# Altium footprint library DrPCB.PcbLib: 910 footprints (part 57 of 57)
Each footprint in its own frame and in the unit in brackets; x right, y up, seen from the top. Pads: shape width x height; smd on the part's side, far side on the other; paste and mask are expansions set on the pad; w line width, h text height; cw(c..) or ccw(c..) is an arc to the next point about the centre after c.
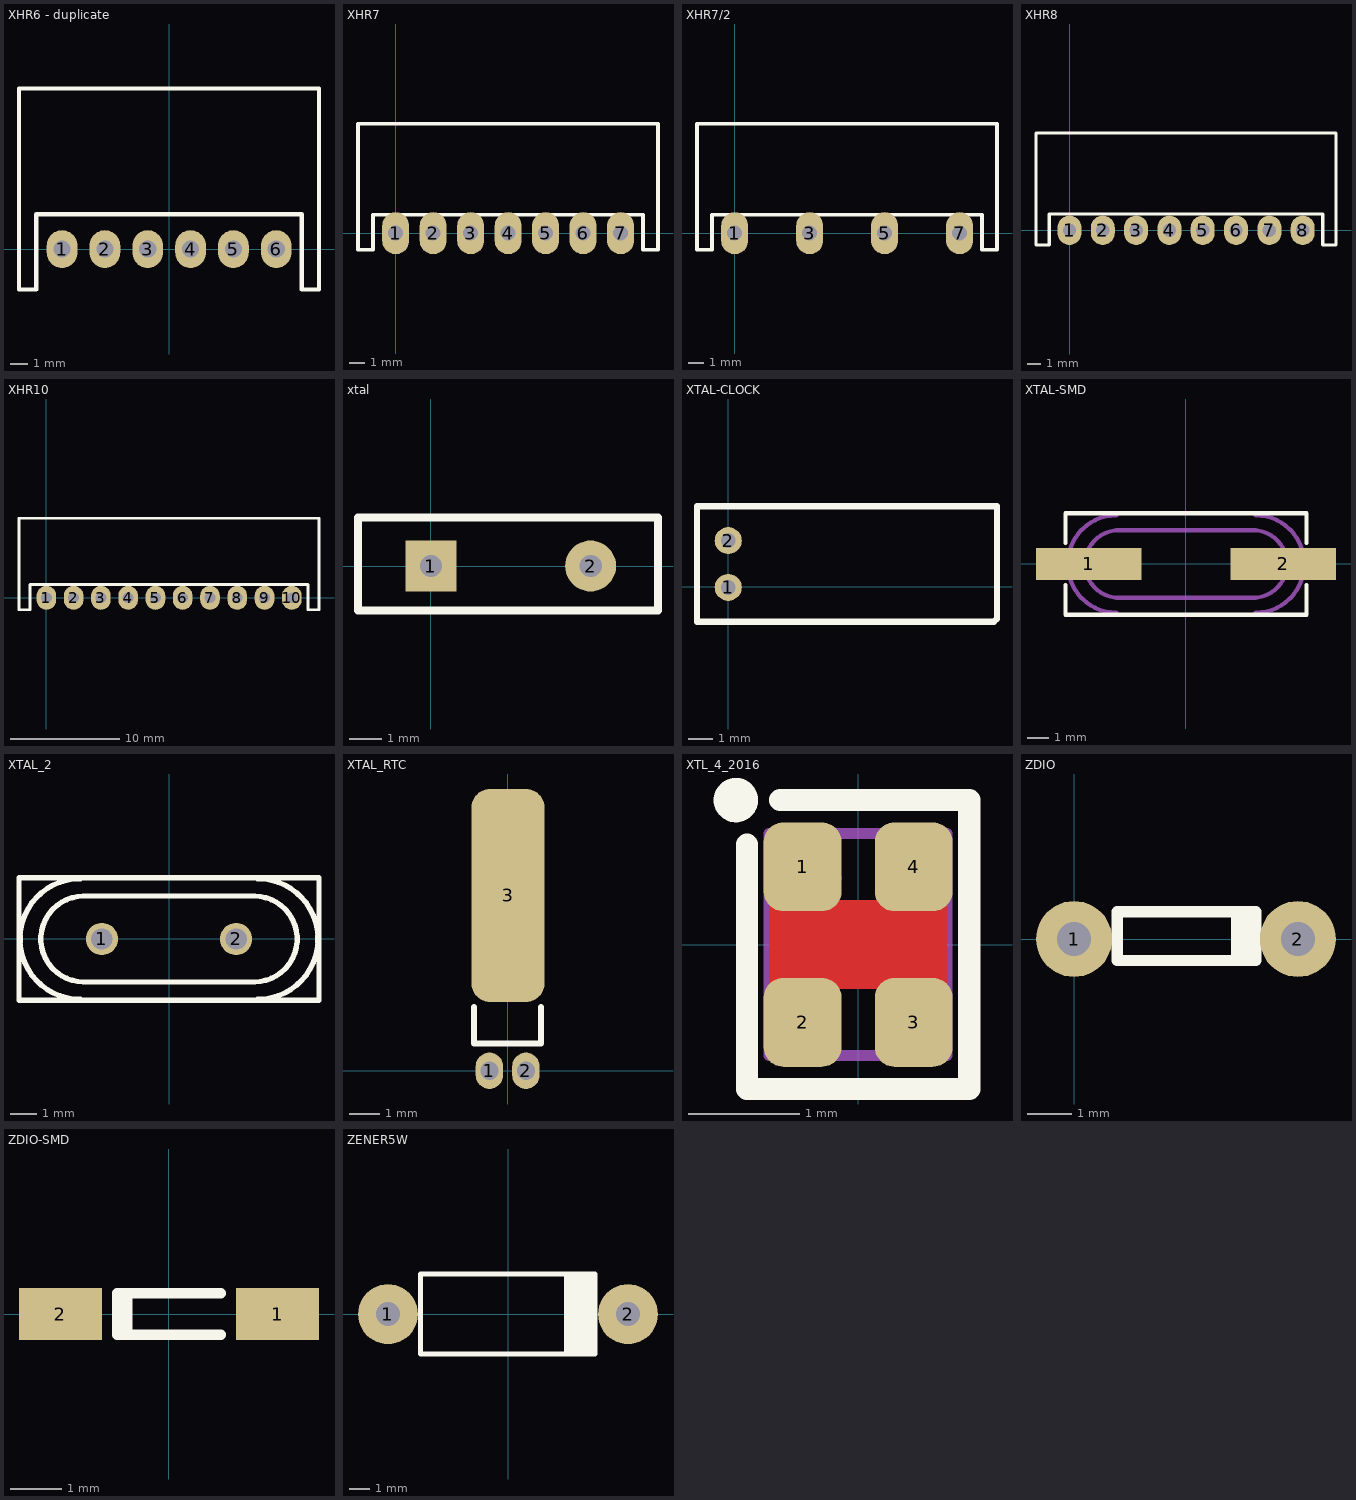
[diagram p56: the footprints below, top view; thin cyan lines are the x and y axes]

## XHR6 - duplicate [mm]
pads (6):
  oval 1.8x2.2 hole 1: 1(-6.25,0) 2(-3.75,0) 3(-1.25,0) 4(1.25,0) 5(3.75,0) 6(6.25,0)
Top Overlay:
  lines w0.254: -8.763,-2.362 -8.763,9.373 8.745,9.373 8.745,-2.362 7.745,-2.362 7.745,2.032 -7.763,2.032 -7.763,-2.362 -8.763,-2.362
3D body "User Library-S XH-A.step": height 6.1, standoff -2, extent -8.713,-2.254 8.687,9.246

## XHR7 [mm]
pads (7):
  oval 1.8x2.8 hole 1: 1(0,0) 2(2.5,0) 3(5,0) 4(7.5,0) 5(10,0) 6(12.5,0) 7(15.004,0)
Top Overlay:
  lines w0.254: -2.515,7.3 17.475,7.3 ; -2.513,7.3 -2.513,-1.1 -1.513,-1.1 -1.513,1.227 ; -1.511,1.227 16.497,1.227 16.497,-1.1 17.497,-1.1 17.497,7.3

## XHR7/2 [mm]
pads (4):
  oval 1.8x2.8 hole 1: 1(0,0) 3(5,0) 5(10,0) 7(15.004,0)
Top Overlay:
  lines w0.254: -2.515,7.3 17.475,7.3 ; -2.513,7.3 -2.513,-1.1 -1.513,-1.1 -1.513,1.227 ; -1.511,1.227 16.497,1.227 16.497,-1.1 17.497,-1.1 17.497,7.3

## XHR8 [mm]
pads (8):
  oval 1.8x2.2 hole 1: 1(0,0) 2(2.5,0) 3(5,0) 4(7.5,0) 5(10,0) 6(12.5,0) 7(15.004,0) 8(17.504,0)
Top Overlay:
  lines w0.254: -2.515,7.3 20.002,7.3 ; -2.513,7.3 -2.513,-1.1 -1.513,-1.1 -1.513,1.227 ; -1.511,1.227 18.974,1.227 ; 18.999,1.227 18.999,-1.1 19.999,-1.1 19.999,7.3

## XHR10 [mm]
pads (10):
  oval 1.8x2.2 hole 1: 1(0,0) 2(2.5,0) 3(5,0) 4(7.5,0) 5(10,0) 6(12.5,0) 7(15.004,0) 8(17.504,0) 9(20.008,0) 10(22.508,0)
Top Overlay:
  lines w0.254: -2.515,7.3 24.981,7.3 ; -2.513,7.3 -2.513,-1.1 -1.513,-1.1 -1.513,1.227 ; -1.511,1.227 23.927,1.227 ; 24.002,1.227 24.002,-1.1 25.003,-1.1 25.003,7.3

## xtal [mm]
pads (2):
  rect 1.6x1.6 hole 0.7: 1(0,0)
  round 1.6 hole 0.7: 2(5,0)
Top Overlay:
  lines w0.254: -2.286,-1.397 -2.286,1.524 7.112,1.524 7.112,-1.397 -2.286,-1.397

## XTAL-CLOCK [mm]
pads (2):
  round 1.1 hole 0.6: 1(0.007,-0.021) 2(0.007,1.884)
Top Overlay:
  lines w0.254: -1.263,-1.418 10.802,-1.418 10.929,-1.291 10.929,3.281 -1.263,3.281 -1.263,-1.418

## XTAL-SMD [mm]
pads (2):
  rect 5x1.5 smd: 1(-4.6,0) 2(4.6,0)
Top Overlay:
  lines w0.2: -5.7,-1 -5.7,-2.4 5.7,-2.4 5.7,-1 ; -5.7,1 -5.7,2.4 5.7,2.4 5.7,1
Mechanical 13:
  lines w0.2: -3.302,-2.3 cw(c-3.302,0) -3.302,2.3 ; -3.302,-1.6 3.302,-1.6 ; -3.302,1.6 3.302,1.6 ; -3.175,-1.6 cw(c-3.175,0) -3.175,1.6 ; 3.175,-1.6 ccw(c3.175,0) 3.175,1.6 ; 3.302,-2.3 ccw(c3.302,0) 3.302,2.3
3D body "User Library-Crystal HC49_US-SM.step": height 4.3, standoff 0, extent -6.4,-2.415 6.4,2.415

## XTAL_2 [mm] "Crystal PTH HC49S"
height 5.08
pads (2):
  round 1.2 / inner oval 1.2x2 / far side oval 1.2x2 hole 0.8: 1(-2.5,0)
  round 1.2 / inner round 1.2 / far side oval 1.2x2 hole 0.8: 2(2.5,0)
Top Overlay:
  lines w0.2: -3.302,-2.25 cw(c-3.302,0) -3.302,2.25 ; -3.2,-1.6 3.2,-1.6 ; -3.2,1.6 3.2,1.6 ; -3.175,-1.6 cw(c-3.175,0) -3.175,1.6 ; 3.175,-1.6 ccw(c3.175,0) 3.175,1.6 ; 3.302,-2.25 ccw(c3.302,0) 3.302,2.25 ; -5.588,-2.286 -5.588,2.286 5.588,2.286 5.588,-2.286 -5.588,-2.286
3D body "HC-49_LT_THT_16MHz.step": height 3.6, standoff -1.99, extent -5.668,-2.325 5.669,2.325

## XTAL_RTC [mm] "CRYSTAL RTC SLEEP, AB26T"
height 2.3
pads (3):
  oval 0.9x1.2 hole 0.6 mask+0.1: 1(-0.6,0) 2(0.6,0)
  rrect50% 2.4x7 smd: 3(0.011,5.763)
Top Overlay:
  lines w0.2: -1.1,2.1 -1.1,0.9 1.1,0.9 1.1,2.1
3D body "User Library-DT-26-1.step": height 2, standoff -2, extent -1,-0.1 1,7.04

## XTL_4_2016 [mm] "ABM11"
height 0.7
pads (4):
  rrect50% 0.7x0.8 smd mask+0.075: 1(-0.5,0.7) 2(-0.5,-0.7) 3(0.5,-0.7) 4(0.5,0.7)
Top Layer:
  pour cut-out: -0.8,0.4 -0.8,-0.4 0.8,-0.4 0.8,0.4
Top Overlay:
  circle w0.2: c-1.1,1.3 r0.1
  lines w0.2: -1,0.9 -1,-1.3 1,-1.3 1,1.3 -0.7,1.3
Mechanical 13:
  circle w0.1: c-0.4,0.6 r0.2
  lines w0.1: -0.8,-1 -0.8,1 0.8,1 0.8,-1 -0.8,-1
3D body "XTL_4_200X160-XRCGB27M000F2P00R0.step": height 0.65, standoff 0, extent -0.8,-1 0.8,1

## ZDIO [mm]
pads (2):
  round 1.7 hole 0.762: 1(0,0) 2(5,0)
Top Overlay:
  lines w0.254: 3.631,-0.422 3.631,0.605 ; 3.854,-0.48 3.854,0.605 ; 4.062,-0.48 0.961,-0.48 0.961,0.605 4.062,0.605 4.062,-0.48 ; 4.062,-0.48 4.062,-0.48

## ZDIO-SMD [mm]
pads (2):
  rect 1.6x1 smd: 1(2.1,0) 2(-2.1,0)
Top Overlay:
  lines w0.2: -0.81,-0.4 -0.81,0.4 ; 1,-0.4 -1,-0.4 -1,0.4 1,0.4

## ZENER5W [mm]
pads (2):
  round 3 hole 1.2: 1(-6,0) 2(6,0)
Top Overlay:
  rectangle: 2.794,-1.994 4.305,1.981
  lines w0.254: 4.331,-1.994 -4.369,-1.994 -4.369,2.006 4.356,2.006 4.356,-1.994